# Altium schematic symbol library WR-TBL_Pluggable PCB Header.SchLib: 719 symbols (part 4 of 5) (continued)
## 691701310012B
designator P?
WR-TBL Serie 7013B Vertical PCB Header THR Type, Pluggable, pitch 3.81mm, 12p; Part Number: 691701310012B; Compliance: RoHS; Modularity: No; Pin Number: 12; Rated Current [UL]: 10A; Working Voltage [UL]: 300VAC; ComponentLink1Description: Manufacturer; ComponentLink1URL: http://www.we-online.de; ComponentLink2URL: https://katalog.we-online.de/em/datasheet/691701310012B.pdf; ComponentLink2Description: Datasheet; Mounting Technology: THR; Packaging: Box; Operating Temperature: -40 to +105degC; PCB/Cable/Panel: PCB; Pitch: 3.81mm; Published Date: October 2019; Type: Vertical; Publisher: Wurth Elektronik; Application: Pluggable
footprint 691701310012B
pins: 1, 2, 3, 4, 5, 6, 7, 8, 9, 10, 11, 12

## 691701320002B
designator P?
WR-TBL Serie 7013 Vertical PCB Header THR Type with Flanges, Pluggable, pitch 3.81mm, 2p; Part Number: 691701320002B; Compliance: RoHS; Modularity: No; Pin Number: 2; Rated Current [UL]: 10A; Working Voltage [UL]: 300VAC; ComponentLink1Description: Manufacturer; ComponentLink1URL: http://www.we-online.de; ComponentLink2URL: https://katalog.we-online.de/em/datasheet/691701320002B.pdf; ComponentLink2Description: Datasheet; Mounting Technology: THR; Packaging: Box; Operating Temperature: -40 to +105degC; PCB/Cable/Panel: PCB; Pitch: 3.81mm; Published Date: October 2019; Type: Vertical; Publisher: Wurth Elektronik; Application: Pluggable
footprint 691701320002B
pins: 1, 2

## 691701320003B
designator P?
WR-TBL Serie 7013 Vertical PCB Header THR Type with Flanges, Pluggable, pitch 3.81mm, 3p; Part Number: 691701320003B; Compliance: RoHS; Modularity: No; Pin Number: 3; Rated Current [UL]: 10A; Working Voltage [UL]: 300VAC; ComponentLink1Description: Manufacturer; ComponentLink1URL: http://www.we-online.de; ComponentLink2URL: https://katalog.we-online.de/em/datasheet/691701320003B.pdf; ComponentLink2Description: Datasheet; Mounting Technology: THR; Packaging: Box; Operating Temperature: -40 to +105degC; PCB/Cable/Panel: PCB; Pitch: 3.81mm; Published Date: October 2019; Type: Vertical; Publisher: Wurth Elektronik; Application: Pluggable
footprint 691701320003B
pins: 1, 2, 3

## 691701320004B
designator P?
WR-TBL Serie 7013 Vertical PCB Header THR Type with Flanges, Pluggable, pitch 3.81mm, 4p; Part Number: 691701320004B; Compliance: RoHS; Modularity: No; Pin Number: 4; Rated Current [UL]: 10A; Working Voltage [UL]: 300VAC; ComponentLink1Description: Manufacturer; ComponentLink1URL: http://www.we-online.de; ComponentLink2URL: https://katalog.we-online.de/em/datasheet/691701320004B.pdf; ComponentLink2Description: Datasheet; Mounting Technology: THR; Packaging: Box; Operating Temperature: -40 to +105degC; PCB/Cable/Panel: PCB; Pitch: 3.81mm; Published Date: October 2019; Type: Vertical; Publisher: Wurth Elektronik; Application: Pluggable
footprint 691701320004B
pins: 1, 2, 3, 4

## 691701320005B
designator P?
WR-TBL Serie 7013 Vertical PCB Header THR Type with Flanges, Pluggable, pitch 3.81mm, 5p; Part Number: 691701320005B; Compliance: RoHS; Modularity: No; Pin Number: 5; Rated Current [UL]: 10A; Working Voltage [UL]: 300VAC; ComponentLink1Description: Manufacturer; ComponentLink1URL: http://www.we-online.de; ComponentLink2URL: https://katalog.we-online.de/em/datasheet/691701320005B.pdf; ComponentLink2Description: Datasheet; Mounting Technology: THR; Packaging: Box; Operating Temperature: -40 to +105degC; PCB/Cable/Panel: PCB; Pitch: 3.81mm; Published Date: October 2019; Type: Vertical; Publisher: Wurth Elektronik; Application: Pluggable
footprint 691701320005B
pins: 1, 2, 3, 4, 5

## 691701320006B
designator P?
WR-TBL Serie 7013 Vertical PCB Header THR Type with Flanges, Pluggable, pitch 3.81mm, 6p; Part Number: 691701320006B; Compliance: RoHS; Modularity: No; Pin Number: 6; Rated Current [UL]: 10A; Working Voltage [UL]: 300VAC; ComponentLink1Description: Manufacturer; ComponentLink1URL: http://www.we-online.de; ComponentLink2URL: https://katalog.we-online.de/em/datasheet/691701320006B.pdf; ComponentLink2Description: Datasheet; Mounting Technology: THR; Packaging: Box; Operating Temperature: -40 to +105degC; PCB/Cable/Panel: PCB; Pitch: 3.81mm; Published Date: October 2019; Type: Vertical; Publisher: Wurth Elektronik; Application: Pluggable
footprint 691701320006B
pins: 1, 2, 3, 4, 5, 6

## 691701320007B
designator P?
WR-TBL Serie 7013 Vertical PCB Header THR Type with Flanges, Pluggable, pitch 3.81mm, 7p; Part Number: 691701320007B; Compliance: RoHS; Modularity: No; Pin Number: 7; Rated Current [UL]: 10A; Working Voltage [UL]: 300VAC; ComponentLink1Description: Manufacturer; ComponentLink1URL: http://www.we-online.de; ComponentLink2URL: https://katalog.we-online.de/em/datasheet/691701320007B.pdf; ComponentLink2Description: Datasheet; Mounting Technology: THR; Packaging: Box; Operating Temperature: -40 to +105degC; PCB/Cable/Panel: PCB; Pitch: 3.81mm; Published Date: October 2019; Type: Vertical; Publisher: Wurth Elektronik; Application: Pluggable
footprint 691701320007B
pins: 1, 2, 3, 4, 5, 6, 7

## 691701320008B
designator P?
WR-TBL Serie 7013 Vertical PCB Header THR Type with Flanges, Pluggable, pitch 3.81mm, 8p; Part Number: 691701320008B; Compliance: RoHS; Modularity: No; Pin Number: 8; Rated Current [UL]: 10A; Working Voltage [UL]: 300VAC; ComponentLink1Description: Manufacturer; ComponentLink1URL: http://www.we-online.de; ComponentLink2URL: https://katalog.we-online.de/em/datasheet/691701320008B.pdf; ComponentLink2Description: Datasheet; Mounting Technology: THR; Packaging: Box; Operating Temperature: -40 to +105degC; PCB/Cable/Panel: PCB; Pitch: 3.81mm; Published Date: October 2019; Type: Vertical; Publisher: Wurth Elektronik; Application: Pluggable
footprint 691701320008B
pins: 1, 2, 3, 4, 5, 6, 7, 8

## 691701320009B
designator P?
WR-TBL Serie 7013 Vertical PCB Header THR Type with Flanges, Pluggable, pitch 3.81mm, 9p; Part Number: 691701320009B; Compliance: RoHS; Modularity: No; Pin Number: 9; Rated Current [UL]: 10A; Working Voltage [UL]: 300VAC; ComponentLink1Description: Manufacturer; ComponentLink1URL: http://www.we-online.de; ComponentLink2URL: https://katalog.we-online.de/em/datasheet/691701320009B.pdf; ComponentLink2Description: Datasheet; Mounting Technology: THR; Packaging: Box; Operating Temperature: -40 to +105degC; PCB/Cable/Panel: PCB; Pitch: 3.81mm; Published Date: October 2019; Type: Vertical; Publisher: Wurth Elektronik; Application: Pluggable
footprint 691701320009B
pins: 1, 2, 3, 4, 5, 6, 7, 8, 9

## 691701320010B
designator P?
WR-TBL Serie 7013 Vertical PCB Header THR Type with Flanges, Pluggable, pitch 3.81mm, 10p; Part Number: 691701320010B; Compliance: RoHS; Modularity: No; Pin Number: 10; Rated Current [UL]: 10A; Working Voltage [UL]: 300VAC; ComponentLink1Description: Manufacturer; ComponentLink1URL: http://www.we-online.de; ComponentLink2URL: https://katalog.we-online.de/em/datasheet/691701320010B.pdf; ComponentLink2Description: Datasheet; Mounting Technology: THR; Packaging: Box; Operating Temperature: -40 to +105degC; PCB/Cable/Panel: PCB; Pitch: 3.81mm; Published Date: October 2019; Type: Vertical; Publisher: Wurth Elektronik; Application: Pluggable
footprint 691701320010B
pins: 1, 2, 3, 4, 5, 6, 7, 8, 9, 10

## 691701320011B
designator P?
WR-TBL Serie 7013 Vertical PCB Header THR Type with Flanges, Pluggable, pitch 3.81mm, 11p; Part Number: 691701320011B; Compliance: RoHS; Modularity: No; Pin Number: 11; Rated Current [UL]: 10A; Working Voltage [UL]: 300VAC; ComponentLink1Description: Manufacturer; ComponentLink1URL: http://www.we-online.de; ComponentLink2URL: https://katalog.we-online.de/em/datasheet/691701320011B.pdf; ComponentLink2Description: Datasheet; Mounting Technology: THR; Packaging: Box; Operating Temperature: -40 to +105degC; PCB/Cable/Panel: PCB; Pitch: 3.81mm; Published Date: October 2019; Type: Vertical; Publisher: Wurth Elektronik; Application: Pluggable
footprint 691701320011B
pins: 1, 2, 3, 4, 5, 6, 7, 8, 9, 10, 11

## 691701320012B
designator P?
WR-TBL Serie 7013 Vertical PCB Header THR Type with Flanges, Pluggable, pitch 3.81mm, 12p; Part Number: 691701320012B; Compliance: RoHS; Modularity: No; Pin Number: 12; Rated Current [UL]: 10A; Working Voltage [UL]: 300VAC; ComponentLink1Description: Manufacturer; ComponentLink1URL: http://www.we-online.de; ComponentLink2URL: https://katalog.we-online.de/em/datasheet/691701320012B.pdf; ComponentLink2Description: Datasheet; Mounting Technology: THR; Packaging: Box; Operating Temperature: -40 to +105degC; PCB/Cable/Panel: PCB; Pitch: 3.81mm; Published Date: October 2019; Type: Vertical; Publisher: Wurth Elektronik; Application: Pluggable
footprint 691701320012B
pins: 1, 2, 3, 4, 5, 6, 7, 8, 9, 10, 11, 12

## 691701340002B
designator P?
WR-TBL Serie 7013 Horizontal PCB Header THR Type, Pluggable, pitch 3.81mm, 2p; Part Number: 691701340002B; Compliance: RoHS; Modularity: No; Pin Number: 2; Rated Current [UL]: 10A; Working Voltage [UL]: 300VAC; ComponentLink1Description: Manufacturer; ComponentLink1URL: http://www.we-online.de; ComponentLink2URL: https://katalog.we-online.de/em/datasheet/691701340002B.pdf; ComponentLink2Description: Datasheet; Mounting Technology: THR; Packaging: Box; Operating Temperature: -40 to +105degC; PCB/Cable/Panel: PCB; Pitch: 3.81mm; Published Date: October 2019; Type: Horizontal; Publisher: Wurth Elektronik; Application: Pluggable
footprint 691701340002B
pins: 1, 2

## 691701340003B
designator P?
WR-TBL Serie 7013 Horizontal PCB Header THR Type, Pluggable, pitch 3.81mm, 3p; Part Number: 691701340003B; Compliance: RoHS; Modularity: No; Pin Number: 3; Rated Current [UL]: 10A; Working Voltage [UL]: 300VAC; ComponentLink1Description: Manufacturer; ComponentLink1URL: http://www.we-online.de; ComponentLink2URL: https://katalog.we-online.de/em/datasheet/691701340003B.pdf; ComponentLink2Description: Datasheet; Mounting Technology: THR; Packaging: Box; Operating Temperature: -40 to +105degC; PCB/Cable/Panel: PCB; Pitch: 3.81mm; Published Date: October 2019; Type: Horizontal; Publisher: Wurth Elektronik; Application: Pluggable
footprint 691701340003B
pins: 1, 2, 3

## 691701340004B
designator P?
WR-TBL Serie 7013 Horizontal PCB Header THR Type, Pluggable, pitch 3.81mm, 4p; Part Number: 691701340004B; Compliance: RoHS; Modularity: No; Pin Number: 4; Rated Current [UL]: 10A; Working Voltage [UL]: 300VAC; ComponentLink1Description: Manufacturer; ComponentLink1URL: http://www.we-online.de; ComponentLink2URL: https://katalog.we-online.de/em/datasheet/691701340004B.pdf; ComponentLink2Description: Datasheet; Mounting Technology: THR; Packaging: Box; Operating Temperature: -40 to +105degC; PCB/Cable/Panel: PCB; Pitch: 3.81mm; Published Date: October 2019; Type: Horizontal; Publisher: Wurth Elektronik; Application: Pluggable
footprint 691701340004B
pins: 1, 2, 3, 4

## 691701340005B
designator P?
WR-TBL Serie 7013 Horizontal PCB Header THR Type, Pluggable, pitch 3.81mm, 5p; Part Number: 691701340005B; Compliance: RoHS; Modularity: No; Pin Number: 5; Rated Current [UL]: 10A; Working Voltage [UL]: 300VAC; ComponentLink1Description: Manufacturer; ComponentLink1URL: http://www.we-online.de; ComponentLink2URL: https://katalog.we-online.de/em/datasheet/691701340005B.pdf; ComponentLink2Description: Datasheet; Mounting Technology: THR; Packaging: Box; Operating Temperature: -40 to +105degC; PCB/Cable/Panel: PCB; Pitch: 3.81mm; Published Date: October 2019; Type: Horizontal; Publisher: Wurth Elektronik; Application: Pluggable
footprint 691701340005B
pins: 1, 2, 3, 4, 5

## 691701340006B
designator P?
WR-TBL Serie 7013 Horizontal PCB Header THR Type, Pluggable, pitch 3.81mm, 6p; Part Number: 691701340006B; Compliance: RoHS; Modularity: No; Pin Number: 6; Rated Current [UL]: 10A; Working Voltage [UL]: 300VAC; ComponentLink1Description: Manufacturer; ComponentLink1URL: http://www.we-online.de; ComponentLink2URL: https://katalog.we-online.de/em/datasheet/691701340006B.pdf; ComponentLink2Description: Datasheet; Mounting Technology: THR; Packaging: Box; Operating Temperature: -40 to +105degC; PCB/Cable/Panel: PCB; Pitch: 3.81mm; Published Date: October 2019; Type: Horizontal; Publisher: Wurth Elektronik; Application: Pluggable
footprint 691701340006B
pins: 1, 2, 3, 4, 5, 6

## 691701340007B
designator P?
WR-TBL Serie 7013 Horizontal PCB Header THR Type, Pluggable, pitch 3.81mm, 7p; Part Number: 691701340007B; Compliance: RoHS; Modularity: No; Pin Number: 7; Rated Current [UL]: 10A; Working Voltage [UL]: 300VAC; ComponentLink1Description: Manufacturer; ComponentLink1URL: http://www.we-online.de; ComponentLink2URL: https://katalog.we-online.de/em/datasheet/691701340007B.pdf; ComponentLink2Description: Datasheet; Mounting Technology: THR; Packaging: Box; Operating Temperature: -40 to +105degC; PCB/Cable/Panel: PCB; Pitch: 3.81mm; Published Date: October 2019; Type: Horizontal; Publisher: Wurth Elektronik; Application: Pluggable
footprint 691701340007B
pins: 1, 2, 3, 4, 5, 6, 7

## 691701340008B
designator P?
WR-TBL Serie 7013 Horizontal PCB Header THR Type, Pluggable, pitch 3.81mm, 8p; Part Number: 691701340008B; Compliance: RoHS; Modularity: No; Pin Number: 8; Rated Current [UL]: 10A; Working Voltage [UL]: 300VAC; ComponentLink1Description: Manufacturer; ComponentLink1URL: http://www.we-online.de; ComponentLink2URL: https://katalog.we-online.de/em/datasheet/691701340008B.pdf; ComponentLink2Description: Datasheet; Mounting Technology: THR; Packaging: Box; Operating Temperature: -40 to +105degC; PCB/Cable/Panel: PCB; Pitch: 3.81mm; Published Date: October 2019; Type: Horizontal; Publisher: Wurth Elektronik; Application: Pluggable
footprint 691701340008B
pins: 1, 2, 3, 4, 5, 6, 7, 8

## 691701340009B
designator P?
WR-TBL Serie 7013 Horizontal PCB Header THR Type, Pluggable, pitch 3.81mm, 9p; Part Number: 691701340009B; Compliance: RoHS; Modularity: No; Pin Number: 9; Rated Current [UL]: 10A; Working Voltage [UL]: 300VAC; ComponentLink1Description: Manufacturer; ComponentLink1URL: http://www.we-online.de; ComponentLink2URL: https://katalog.we-online.de/em/datasheet/691701340009B.pdf; ComponentLink2Description: Datasheet; Mounting Technology: THR; Packaging: Box; Operating Temperature: -40 to +105degC; PCB/Cable/Panel: PCB; Pitch: 3.81mm; Published Date: October 2019; Type: Horizontal; Publisher: Wurth Elektronik; Application: Pluggable
footprint 691701340009B
pins: 1, 2, 3, 4, 5, 6, 7, 8, 9

## 691701340010B
designator P?
WR-TBL Serie 7013 Horizontal PCB Header THR Type, Pluggable, pitch 3.81mm, 10p; Part Number: 691701340010B; Compliance: RoHS; Modularity: No; Pin Number: 10; Rated Current [UL]: 10A; Working Voltage [UL]: 300VAC; ComponentLink1Description: Manufacturer; ComponentLink1URL: http://www.we-online.de; ComponentLink2URL: https://katalog.we-online.de/em/datasheet/691701340010B.pdf; ComponentLink2Description: Datasheet; Mounting Technology: THR; Packaging: Box; Operating Temperature: -40 to +105degC; PCB/Cable/Panel: PCB; Pitch: 3.81mm; Published Date: October 2019; Type: Horizontal; Publisher: Wurth Elektronik; Application: Pluggable
footprint 691701340010B
pins: 1, 2, 3, 4, 5, 6, 7, 8, 9, 10

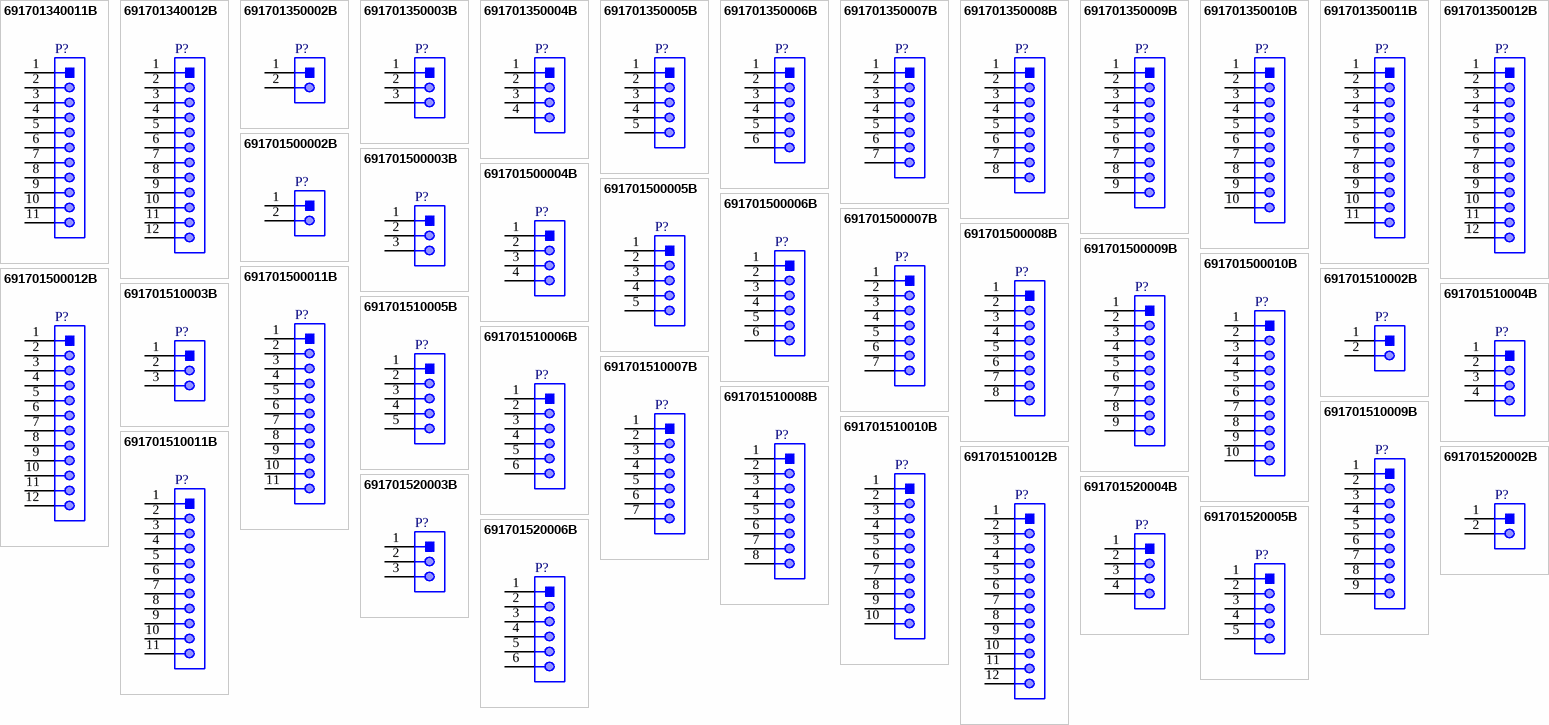
[diagram p16: symbols 691701340011B to 691701520006B]

## 691701340011B
designator P?
WR-TBL Serie 7013 Horizontal PCB Header THR Type, Pluggable, pitch 3.81mm, 11p; Part Number: 691701340011B; Compliance: RoHS; Modularity: No; Pin Number: 11; Rated Current [UL]: 10A; Working Voltage [UL]: 300VAC; ComponentLink1Description: Manufacturer; ComponentLink1URL: http://www.we-online.de; ComponentLink2URL: https://katalog.we-online.de/em/datasheet/691701340011B.pdf; ComponentLink2Description: Datasheet; Mounting Technology: THR; Packaging: Box; Operating Temperature: -40 to +105degC; PCB/Cable/Panel: PCB; Pitch: 3.81mm; Published Date: October 2019; Type: Horizontal; Publisher: Wurth Elektronik; Application: Pluggable
footprint 691701340011B
pins: 1, 2, 3, 4, 5, 6, 7, 8, 9, 10, 11

## 691701340012B
designator P?
WR-TBL Serie 7013 Horizontal PCB Header THR Type, Pluggable, pitch 3.81mm, 12p; Part Number: 691701340012B; Compliance: RoHS; Modularity: No; Pin Number: 12; Rated Current [UL]: 10A; Working Voltage [UL]: 300VAC; ComponentLink1Description: Manufacturer; ComponentLink1URL: http://www.we-online.de; ComponentLink2URL: https://katalog.we-online.de/em/datasheet/691701340012B.pdf; ComponentLink2Description: Datasheet; Mounting Technology: THR; Packaging: Box; Operating Temperature: -40 to +105degC; PCB/Cable/Panel: PCB; Pitch: 3.81mm; Published Date: October 2019; Type: Horizontal; Publisher: Wurth Elektronik; Application: Pluggable
footprint 691701340012B
pins: 1, 2, 3, 4, 5, 6, 7, 8, 9, 10, 11, 12

## 691701350002B
designator P?
WR-TBL Serie 7013 Horizontal PCB Header THR Type with Flanges, Pluggable, pitch 3.81mm, 2p; Part Number: 691701350002B; Compliance: RoHS; Modularity: No; Pin Number: 2; Rated Current [UL]: 10A; Working Voltage [UL]: 300VAC; ComponentLink1Description: Manufacturer; ComponentLink1URL: http://www.we-online.de; ComponentLink2URL: https://katalog.we-online.de/em/datasheet/691701350002B.pdf; ComponentLink2Description: Datasheet; Mounting Technology: THR; Packaging: Box; Operating Temperature: -40 to +105degC; PCB/Cable/Panel: PCB; Pitch: 3.81mm; Published Date: October 2019; Type: Horizontal; Publisher: Wurth Elektronik; Application: Pluggable
footprint 691701350002B
pins: 1, 2

## 691701350003B
designator P?
WR-TBL Serie 7013 Horizontal PCB Header THR Type with Flanges, Pluggable, pitch 3.81mm, 3p; Part Number: 691701350003B; Compliance: RoHS; Modularity: No; Pin Number: 3; Rated Current [UL]: 10A; Working Voltage [UL]: 300VAC; ComponentLink1Description: Manufacturer; ComponentLink1URL: http://www.we-online.de; ComponentLink2URL: https://katalog.we-online.de/em/datasheet/691701350003B.pdf; ComponentLink2Description: Datasheet; Mounting Technology: THR; Packaging: Box; Operating Temperature: -40 to +105degC; PCB/Cable/Panel: PCB; Pitch: 3.81mm; Published Date: October 2019; Type: Horizontal; Publisher: Wurth Elektronik; Application: Pluggable
footprint 691701350003B
pins: 1, 2, 3

## 691701350004B
designator P?
WR-TBL Serie 7013 Horizontal PCB Header THR Type with Flanges, Pluggable, pitch 3.81mm, 4p; Part Number: 691701350004B; Compliance: RoHS; Modularity: No; Pin Number: 4; Rated Current [UL]: 10A; Working Voltage [UL]: 300VAC; ComponentLink1Description: Manufacturer; ComponentLink1URL: http://www.we-online.de; ComponentLink2URL: https://katalog.we-online.de/em/datasheet/691701350004B.pdf; ComponentLink2Description: Datasheet; Mounting Technology: THR; Packaging: Box; Operating Temperature: -40 to +105degC; PCB/Cable/Panel: PCB; Pitch: 3.81mm; Published Date: October 2019; Type: Horizontal; Publisher: Wurth Elektronik; Application: Pluggable
footprint 691701350004B
pins: 1, 2, 3, 4

## 691701350005B
designator P?
WR-TBL Serie 7013 Horizontal PCB Header THR Type with Flanges, Pluggable, pitch 3.81mm, 5p; Part Number: 691701350005B; Compliance: RoHS; Modularity: No; Pin Number: 5; Rated Current [UL]: 10A; Working Voltage [UL]: 300VAC; ComponentLink1Description: Manufacturer; ComponentLink1URL: http://www.we-online.de; ComponentLink2URL: https://katalog.we-online.de/em/datasheet/691701350005B.pdf; ComponentLink2Description: Datasheet; Mounting Technology: THR; Packaging: Box; Operating Temperature: -40 to +105degC; PCB/Cable/Panel: PCB; Pitch: 3.81mm; Published Date: October 2019; Type: Horizontal; Publisher: Wurth Elektronik; Application: Pluggable
footprint 691701350005B
pins: 1, 2, 3, 4, 5

## 691701350006B
designator P?
WR-TBL Serie 7013 Horizontal PCB Header THR Type with Flanges, Pluggable, pitch 3.81mm, 6p; Part Number: 691701350006B; Compliance: RoHS; Modularity: No; Pin Number: 6; Rated Current [UL]: 10A; Working Voltage [UL]: 300VAC; ComponentLink1Description: Manufacturer; ComponentLink1URL: http://www.we-online.de; ComponentLink2URL: https://katalog.we-online.de/em/datasheet/691701350006B.pdf; ComponentLink2Description: Datasheet; Mounting Technology: THR; Packaging: Box; Operating Temperature: -40 to +105degC; PCB/Cable/Panel: PCB; Pitch: 3.81mm; Published Date: October 2019; Type: Horizontal; Publisher: Wurth Elektronik; Application: Pluggable
footprint 691701350006B
pins: 1, 2, 3, 4, 5, 6

## 691701350007B
designator P?
WR-TBL Serie 7013 Horizontal PCB Header THR Type with Flanges, Pluggable, pitch 3.81mm, 7p; Part Number: 691701350007B; Compliance: RoHS; Modularity: No; Pin Number: 7; Rated Current [UL]: 10A; Working Voltage [UL]: 300VAC; ComponentLink1Description: Manufacturer; ComponentLink1URL: http://www.we-online.de; ComponentLink2URL: https://katalog.we-online.de/em/datasheet/691701350007B.pdf; ComponentLink2Description: Datasheet; Mounting Technology: THR; Packaging: Box; Operating Temperature: -40 to +105degC; PCB/Cable/Panel: PCB; Pitch: 3.81mm; Published Date: October 2019; Type: Horizontal; Publisher: Wurth Elektronik; Application: Pluggable
footprint 691701350007B
pins: 1, 2, 3, 4, 5, 6, 7

## 691701350008B
designator P?
WR-TBL Serie 7013 Horizontal PCB Header THR Type with Flanges, Pluggable, pitch 3.81mm, 8p; Part Number: 691701350008B; Compliance: RoHS; Modularity: No; Pin Number: 8; Rated Current [UL]: 10A; Working Voltage [UL]: 300VAC; ComponentLink1Description: Manufacturer; ComponentLink1URL: http://www.we-online.de; ComponentLink2URL: https://katalog.we-online.de/em/datasheet/691701350008B.pdf; ComponentLink2Description: Datasheet; Mounting Technology: THR; Packaging: Box; Operating Temperature: -40 to +105degC; PCB/Cable/Panel: PCB; Pitch: 3.81mm; Published Date: October 2019; Type: Horizontal; Publisher: Wurth Elektronik; Application: Pluggable
footprint 691701350008B
pins: 1, 2, 3, 4, 5, 6, 7, 8

## 691701350009B
designator P?
WR-TBL Serie 7013 Horizontal PCB Header THR Type with Flanges, Pluggable, pitch 3.81mm, 9p; Part Number: 691701350009B; Compliance: RoHS; Modularity: No; Pin Number: 9; Rated Current [UL]: 10A; Working Voltage [UL]: 300VAC; ComponentLink1Description: Manufacturer; ComponentLink1URL: http://www.we-online.de; ComponentLink2URL: https://katalog.we-online.de/em/datasheet/691701350009B.pdf; ComponentLink2Description: Datasheet; Mounting Technology: THR; Packaging: Box; Operating Temperature: -40 to +105degC; PCB/Cable/Panel: PCB; Pitch: 3.81mm; Published Date: October 2019; Type: Horizontal; Publisher: Wurth Elektronik; Application: Pluggable
footprint 691701350009B
pins: 1, 2, 3, 4, 5, 6, 7, 8, 9

## 691701350010B
designator P?
WR-TBL Serie 7013 Horizontal PCB Header THR Type with Flanges, Pluggable, pitch 3.81mm, 10p; Part Number: 691701350010B; Compliance: RoHS; Modularity: No; Pin Number: 10; Rated Current [UL]: 10A; Working Voltage [UL]: 300VAC; ComponentLink1Description: Manufacturer; ComponentLink1URL: http://www.we-online.de; ComponentLink2URL: https://katalog.we-online.de/em/datasheet/691701350010B.pdf; ComponentLink2Description: Datasheet; Mounting Technology: THR; Packaging: Box; Operating Temperature: -40 to +105degC; PCB/Cable/Panel: PCB; Pitch: 3.81mm; Published Date: October 2019; Type: Horizontal; Publisher: Wurth Elektronik; Application: Pluggable
footprint 691701350010B
pins: 1, 2, 3, 4, 5, 6, 7, 8, 9, 10

## 691701350011B
designator P?
WR-TBL Serie 7013 Horizontal PCB Header THR Type with Flanges, Pluggable, pitch 3.81mm, 11p; Part Number: 691701350011B; Compliance: RoHS; Modularity: No; Pin Number: 11; Rated Current [UL]: 10A; Working Voltage [UL]: 300VAC; ComponentLink1Description: Manufacturer; ComponentLink1URL: http://www.we-online.de; ComponentLink2URL: https://katalog.we-online.de/em/datasheet/691701350011B.pdf; ComponentLink2Description: Datasheet; Mounting Technology: THR; Packaging: Box; Operating Temperature: -40 to +105degC; PCB/Cable/Panel: PCB; Pitch: 3.81mm; Published Date: October 2019; Type: Horizontal; Publisher: Wurth Elektronik; Application: Pluggable
footprint 691701350011B
pins: 1, 2, 3, 4, 5, 6, 7, 8, 9, 10, 11

## 691701350012B
designator P?
WR-TBL Serie 7013 Horizontal PCB Header THR Type with Flanges, Pluggable, pitch 3.81mm, 12p; Part Number: 691701350012B; Compliance: RoHS; Modularity: No; Pin Number: 12; Rated Current [UL]: 10A; Working Voltage [UL]: 300VAC; ComponentLink1Description: Manufacturer; ComponentLink1URL: http://www.we-online.de; ComponentLink2URL: https://katalog.we-online.de/em/datasheet/691701350012B.pdf; ComponentLink2Description: Datasheet; Mounting Technology: THR; Packaging: Box; Operating Temperature: -40 to +105degC; PCB/Cable/Panel: PCB; Pitch: 3.81mm; Published Date: October 2019; Type: Horizontal; Publisher: Wurth Elektronik; Application: Pluggable
footprint 691701350012B
pins: 1, 2, 3, 4, 5, 6, 7, 8, 9, 10, 11, 12

## 691701500002B
designator P?
WR-TBL Serie 7015B Open Vertical PCB Header THR Type, Pluggable, pitch 5.08mm, 2p; Part Number: 691701500002B; Compliance: RoHS; Modularity: No; Pin Number: 2; Rated Current [UL]: 10A; Working Voltage [UL]: 300VAC; ComponentLink1Description: Manufacturer; ComponentLink1URL: http://www.we-online.de; ComponentLink2URL: https://katalog.we-online.de/em/datasheet/691701500002B.pdf; ComponentLink2Description: Datasheet; Mounting Technology: THR; Packaging: Box; Operating Temperature: -40 to +105degC; PCB/Cable/Panel: PCB; Pitch: 5.08mm; Published Date: October 2019; Type: Vertical; Publisher: Wurth Elektronik; Application: Pluggable
footprint 691701500002B
pins: 1, 2

## 691701500003B
designator P?
WR-TBL Serie 7015B Open Vertical PCB Header THR Type, Pluggable, pitch 5.08mm, 3p; Part Number: 691701500003B; Compliance: RoHS; Modularity: No; Pin Number: 3; Rated Current [UL]: 10A; Working Voltage [UL]: 300VAC; ComponentLink1Description: Manufacturer; ComponentLink1URL: http://www.we-online.de; ComponentLink2URL: https://katalog.we-online.de/em/datasheet/691701500003B.pdf; ComponentLink2Description: Datasheet; Mounting Technology: THR; Packaging: Box; Operating Temperature: -40 to +105degC; PCB/Cable/Panel: PCB; Pitch: 5.08mm; Published Date: October 2019; Type: Vertical; Publisher: Wurth Elektronik; Application: Pluggable
footprint 691701500003B
pins: 1, 2, 3

## 691701500004B
designator P?
WR-TBL Serie 7015B Open Vertical PCB Header THR Type, Pluggable, pitch 5.08mm, 4p; Part Number: 691701500004B; Compliance: RoHS; Modularity: No; Pin Number: 4; Rated Current [UL]: 10A; Working Voltage [UL]: 300VAC; ComponentLink1Description: Manufacturer; ComponentLink1URL: http://www.we-online.de; ComponentLink2URL: https://katalog.we-online.de/em/datasheet/691701500004B.pdf; ComponentLink2Description: Datasheet; Mounting Technology: THR; Packaging: Box; Operating Temperature: -40 to +105degC; PCB/Cable/Panel: PCB; Pitch: 5.08mm; Published Date: October 2019; Type: Vertical; Publisher: Wurth Elektronik; Application: Pluggable
footprint 691701500004B
pins: 1, 2, 3, 4

## 691701500005B
designator P?
WR-TBL Serie 7015B Open Vertical PCB Header THR Type, Pluggable, pitch 5.08mm, 5p; Part Number: 691701500005B; Compliance: RoHS; Modularity: No; Pin Number: 5; Rated Current [UL]: 10A; Working Voltage [UL]: 300VAC; ComponentLink1Description: Manufacturer; ComponentLink1URL: http://www.we-online.de; ComponentLink2URL: https://katalog.we-online.de/em/datasheet/691701500005B.pdf; ComponentLink2Description: Datasheet; Mounting Technology: THR; Packaging: Box; Operating Temperature: -40 to +105degC; PCB/Cable/Panel: PCB; Pitch: 5.08mm; Published Date: October 2019; Type: Vertical; Publisher: Wurth Elektronik; Application: Pluggable
footprint 691701500005B
pins: 1, 2, 3, 4, 5

## 691701500006B
designator P?
WR-TBL Serie 7015B Open Vertical PCB Header THR Type, Pluggable, pitch 5.08mm, 6p; Part Number: 691701500006B; Compliance: RoHS; Modularity: No; Pin Number: 6; Rated Current [UL]: 10A; Working Voltage [UL]: 300VAC; ComponentLink1Description: Manufacturer; ComponentLink1URL: http://www.we-online.de; ComponentLink2URL: https://katalog.we-online.de/em/datasheet/691701500006B.pdf; ComponentLink2Description: Datasheet; Mounting Technology: THR; Packaging: Box; Operating Temperature: -40 to +105degC; PCB/Cable/Panel: PCB; Pitch: 5.08mm; Published Date: October 2019; Type: Vertical; Publisher: Wurth Elektronik; Application: Pluggable
footprint 691701500006B
pins: 1, 2, 3, 4, 5, 6

## 691701500007B
designator P?
WR-TBL Serie 7015B Open Vertical PCB Header THR Type, Pluggable, pitch 5.08mm, 7p; Part Number: 691701500007B; Compliance: RoHS; Modularity: No; Pin Number: 7; Rated Current [UL]: 10A; Working Voltage [UL]: 300VAC; ComponentLink1Description: Manufacturer; ComponentLink1URL: http://www.we-online.de; ComponentLink2URL: https://katalog.we-online.de/em/datasheet/691701500007B.pdf; ComponentLink2Description: Datasheet; Mounting Technology: THR; Packaging: Box; Operating Temperature: -40 to +105degC; PCB/Cable/Panel: PCB; Pitch: 5.08mm; Published Date: October 2019; Type: Vertical; Publisher: Wurth Elektronik; Application: Pluggable
footprint 691701500007B
pins: 1, 2, 3, 4, 5, 6, 7

## 691701500008B
designator P?
WR-TBL Serie 7015B Open Vertical PCB Header THR Type, Pluggable, pitch 5.08mm, 8p; Part Number: 691701500008B; Compliance: RoHS; Modularity: No; Pin Number: 8; Rated Current [UL]: 10A; Working Voltage [UL]: 300VAC; ComponentLink1Description: Manufacturer; ComponentLink1URL: http://www.we-online.de; ComponentLink2URL: https://katalog.we-online.de/em/datasheet/691701500008B.pdf; ComponentLink2Description: Datasheet; Mounting Technology: THR; Packaging: Box; Operating Temperature: -40 to +105degC; PCB/Cable/Panel: PCB; Pitch: 5.08mm; Published Date: October 2019; Type: Vertical; Publisher: Wurth Elektronik; Application: Pluggable
footprint 691701500008B
pins: 1, 2, 3, 4, 5, 6, 7, 8

## 691701500009B
designator P?
WR-TBL Serie 7015B Open Vertical PCB Header THR Type, Pluggable, pitch 5.08mm, 9p; Part Number: 691701500009B; Compliance: RoHS; Modularity: No; Pin Number: 9; Rated Current [UL]: 10A; Working Voltage [UL]: 300VAC; ComponentLink1Description: Manufacturer; ComponentLink1URL: http://www.we-online.de; ComponentLink2URL: https://katalog.we-online.de/em/datasheet/691701500009B.pdf; ComponentLink2Description: Datasheet; Mounting Technology: THR; Packaging: Box; Operating Temperature: -40 to +105degC; PCB/Cable/Panel: PCB; Pitch: 5.08mm; Published Date: October 2019; Type: Vertical; Publisher: Wurth Elektronik; Application: Pluggable
footprint 691701500009B
pins: 1, 2, 3, 4, 5, 6, 7, 8, 9

## 691701500010B
designator P?
WR-TBL Serie 7015B Open Vertical PCB Header THR Type, Pluggable, pitch 5.08mm, 10p; Part Number: 691701500010B; Compliance: RoHS; Modularity: No; Pin Number: 10; Rated Current [UL]: 10A; Working Voltage [UL]: 300VAC; ComponentLink1Description: Manufacturer; ComponentLink1URL: http://www.we-online.de; ComponentLink2URL: https://katalog.we-online.de/em/datasheet/691701500010B.pdf; ComponentLink2Description: Datasheet; Mounting Technology: THR; Packaging: Box; Operating Temperature: -40 to +105degC; PCB/Cable/Panel: PCB; Pitch: 5.08mm; Published Date: October 2019; Type: Vertical; Publisher: Wurth Elektronik; Application: Pluggable
footprint 691701500010B
pins: 1, 2, 3, 4, 5, 6, 7, 8, 9, 10

## 691701500011B
designator P?
WR-TBL Serie 7015B Open Vertical PCB Header THR Type, Pluggable, pitch 5.08mm, 11p; Part Number: 691701500011B; Compliance: RoHS; Modularity: No; Pin Number: 11; Rated Current [UL]: 10A; Working Voltage [UL]: 300VAC; ComponentLink1Description: Manufacturer; ComponentLink1URL: http://www.we-online.de; ComponentLink2URL: https://katalog.we-online.de/em/datasheet/691701500011B.pdf; ComponentLink2Description: Datasheet; Mounting Technology: THR; Packaging: Box; Operating Temperature: -40 to +105degC; PCB/Cable/Panel: PCB; Pitch: 5.08mm; Published Date: October 2019; Type: Vertical; Publisher: Wurth Elektronik; Application: Pluggable
footprint 691701500011B
pins: 1, 2, 3, 4, 5, 6, 7, 8, 9, 10, 11

## 691701500012B
designator P?
WR-TBL Serie 7015B Open Vertical PCB Header THR Type, Pluggable, pitch 5.08mm, 12p; Part Number: 691701500012B; Compliance: RoHS; Modularity: No; Pin Number: 12; Rated Current [UL]: 10A; Working Voltage [UL]: 300VAC; ComponentLink1Description: Manufacturer; ComponentLink1URL: http://www.we-online.de; ComponentLink2URL: https://katalog.we-online.de/em/datasheet/691701500012B.pdf; ComponentLink2Description: Datasheet; Mounting Technology: THR; Packaging: Box; Operating Temperature: -40 to +105degC; PCB/Cable/Panel: PCB; Pitch: 5.08mm; Published Date: October 2019; Type: Vertical; Publisher: Wurth Elektronik; Application: Pluggable
footprint 691701500012B
pins: 1, 2, 3, 4, 5, 6, 7, 8, 9, 10, 11, 12

## 691701510002B
designator P?
WR-TBL Serie 7015B Close Vertical PCB Header THR Type, Pluggable, pitch 5.08mm, 2p; Part Number: 691701510002B; Compliance: RoHS; Modularity: No; Pin Number: 2; Rated Current [UL]: 10A; Working Voltage [UL]: 300VAC; ComponentLink1Description: Manufacturer; ComponentLink1URL: http://www.we-online.de; ComponentLink2URL: https://katalog.we-online.de/em/datasheet/691701510002B.pdf; ComponentLink2Description: Datasheet; Mounting Technology: THR; Packaging: Box; Operating Temperature: -40 to +105degC; PCB/Cable/Panel: PCB; Pitch: 5.08mm; Published Date: October 2019; Type: Vertical; Publisher: Wurth Elektronik; Application: Pluggable
footprint 691701510002B
pins: 1, 2